# Altium footprint library Connectors.PcbLib: 268 footprints (part 20 of 21)
Each footprint in its own frame and in the unit in brackets; x right, y up, seen from the top. Pads: shape width x height; smd on the part's side, far side on the other; paste and mask are expansions set on the pad; w line width, h text height; cw(c..) or ccw(c..) is an arc to the next point about the centre after c.
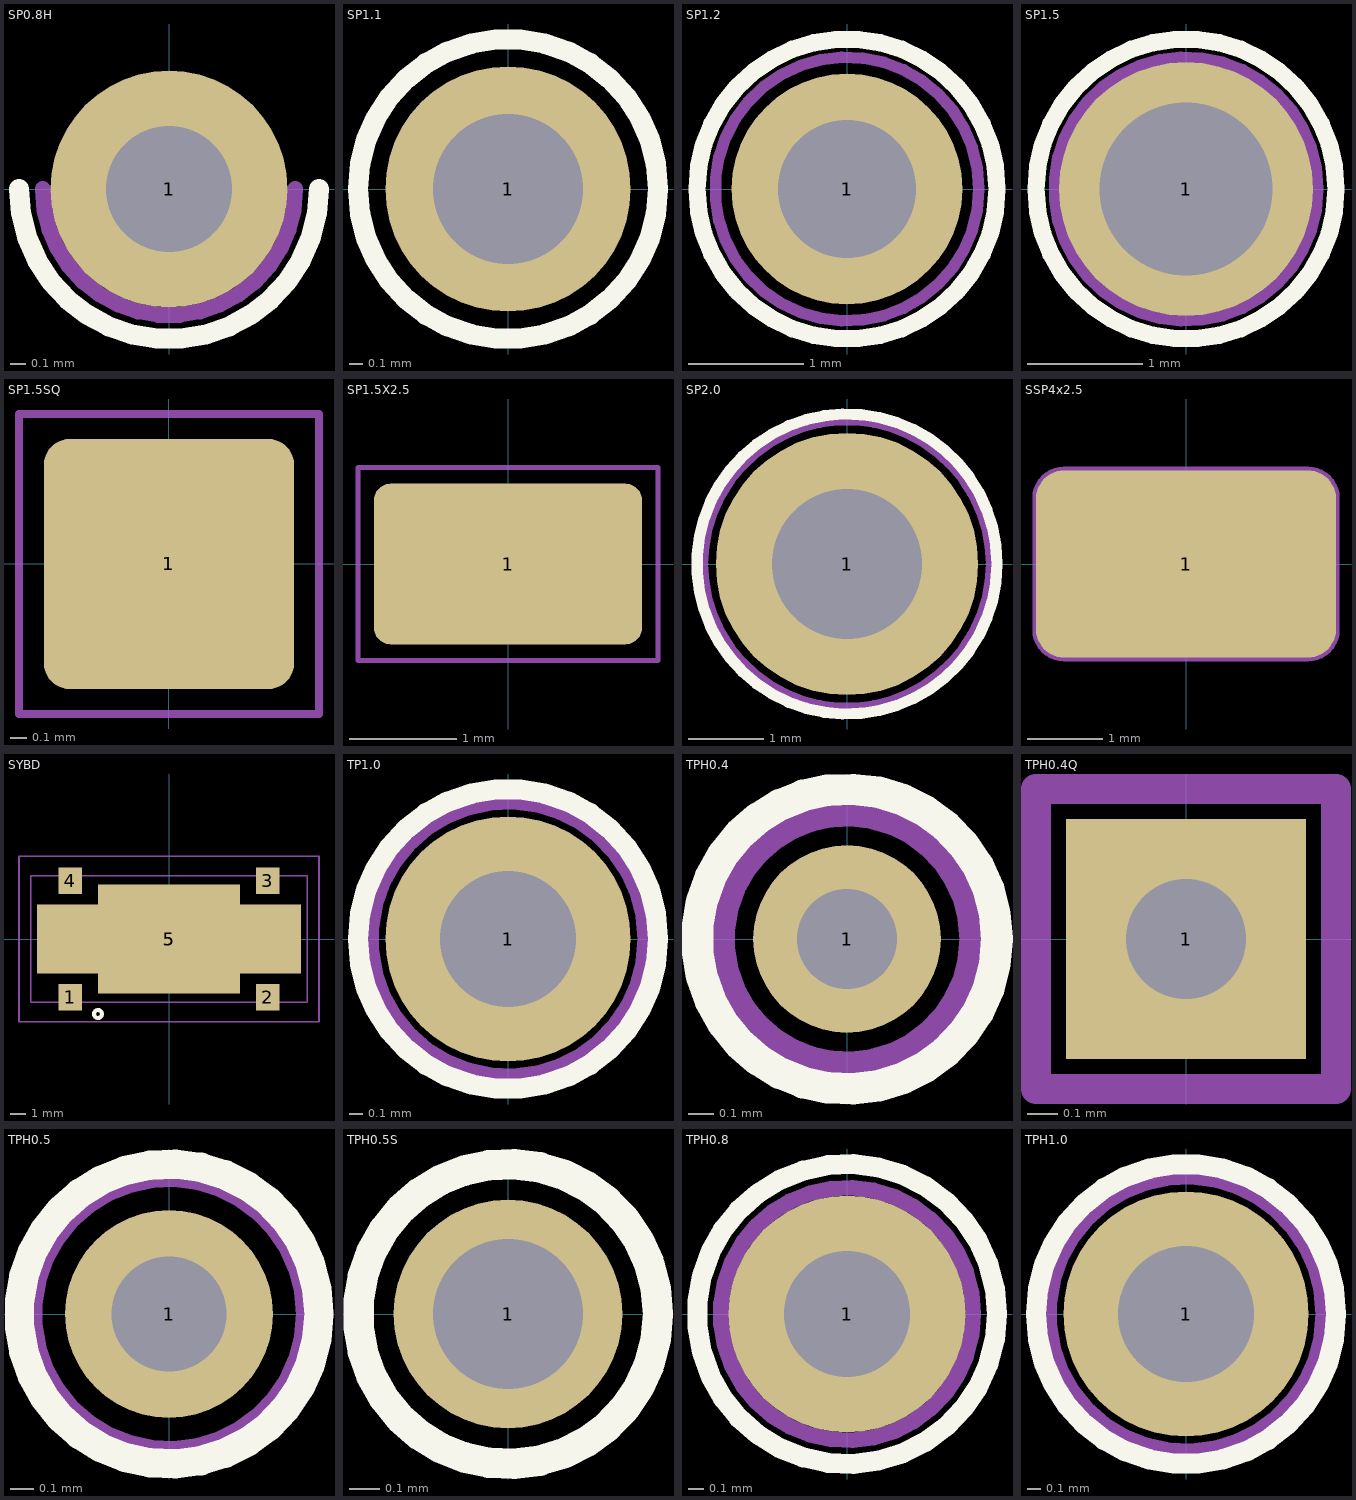
[diagram p19: the footprints below, top view; thin cyan lines are the x and y axes]

## SP0.8H [mm] "Solder pad 0.8mm half moon"
pads (1):
  round 1.5 hole 0.8: 1(0,0)
Top Overlay:
  lines w0.127: -0.95,0 ccw(c0,0) 0.95,0
Mechanical 13:
  lines w0.1: -0.8,0 ccw(c0,0) 0.8,0

## SP1.1 [mm] "Solder Pad 1.1mm"
pads (1):
  round 1.8 hole 1.1: 1(0,0)
Top Overlay:
  circle w0.15: c0,0 r1.1
Mechanical 13:
  circle w0.1: c0,0 r1.1

## SP1.2 [mm] "Solder Pad 1.2mm"
pads (1):
  round 2 hole 1.2: 1(0,0)
Top Overlay:
  circle w0.15: c0,0 r1.3
Mechanical 13:
  circle w0.1: c0,0 r1.143

## SP1.5 [mm] "Solder Pad 1.5mm"
pads (1):
  round 2.2 hole 1.5: 1(0,0)
Top Overlay:
  circle w0.15: c0,0 r1.3
Mechanical 13:
  circle w0.1: c0,0 r1.143

## SP1.5SQ [mm] "Solder Pad 1.5mm SMT"
pads (1):
  rrect20% 1.5x1.5 smd: 1(0,0)
Mechanical 13:
  lines w0.05: -0.9,-0.9 0.9,-0.9 0.9,0.9 -0.9,0.9 -0.9,-0.9

## SP1.5X2.5 [mm] "Solder Pad 1.5x2.5mm SMT"
pads (1):
  rrect20% 2.5x1.5 smd: 1(0,0)
Mechanical 13:
  lines w0.05: -1.4,-0.9 1.4,-0.9 1.4,0.9 -1.4,0.9 -1.4,-0.9

## SP2.0 [mm] "Solder Pin 2.0mm"
pads (1):
  round 3.5 hole 2: 1(0,0)
Top Overlay:
  circle w0.15: c0,0 r2
Mechanical 13:
  circle w0.1: c0,0 r1.9

## SSP4x2.5 [mm] "Solder pad 4x2.5mm SMD"
pads (1):
  rrect30% 4x2.5 smd: 1(0,0)
Mechanical 13:
  lines w0.1: -2,-0.875 ccw(c-1.625,-0.875) -1.625,-1.25 1.625,-1.25 ccw(c1.625,-0.875) 2,-0.875 2,0.875 ccw(c1.625,0.875) 1.625,1.25 -1.625,1.25 ccw(c-1.625,0.875) -2,0.875 -2,-0.875

## SYBD [mil] "High Power Bi-Directional Coupler"
height 129.92
pads (6):
  rect 60x67 smd: 1(-250,-147.5) 2(250,-147.5) 3(250,147.5) 4(-250,147.5)
  rect 670x175 smd: 5(0,0)
  rect 360x275 smd: 5(0,0)
Top Overlay:
  circle w10: c-180,-190 r10
Top Solder:
  rectangle: -340,-47.5 340,47.5
  region: -186,143 -186,88 186,88 186,143
  region: -186,-143 -186,-88 186,-88 186,-143
Mechanical 13:
  lines w4: -350,-160 -350,160 350,160 350,-160 -350,-160
Mechanical 15:
  lines w4: -380,-210 -380,210 380,210 380,-210 -380,-210
3D body: height 131, standoff 130, extent -170,-130 -130.16,-90.08
3D body: height 130, standoff 60, extent -200,-150 200,150
3D body: height 60, standoff 0, extent -350,-160 350,160

## TP1.0 [mm]
pads (1):
  round 1.8 hole 1: 1(0,0)
Top Overlay:
  circle w0.15: c0,0 r1.1
Mechanical 13:
  circle w0.1: c0,0 r1

## TPH0.4 [mm] "Test point TH 0.4mm"
pads (1):
  round 0.75 hole 0.4: 1(0,0)
Top Overlay:
  circle w0.127: c0,0 r0.6
Mechanical 13:
  circle w0.1: c0,0 r0.5

## TPH0.4Q [mm] "Test point TH 0.4mm + Square pad TB"
pads (1):
  rect 0.8x0.8 / inner round 0.8 / far side rect 0.8x0.8 hole 0.4: 1(0,0)
Mechanical 13:
  lines w0.1: -0.5,-0.5 -0.5,0.5 0.5,0.5 0.5,-0.5 -0.5,-0.5

## TPH0.5 [mm] "Test point TH 0.5mm"
pads (1):
  round 0.9 hole 0.5: 1(0,0)
Top Overlay:
  circle w0.127: c0,0 r0.65
Mechanical 13:
  circle w0.1: c0,0 r0.6

## TPH0.5S [mil] "Test point TH 0.5mm slim"
pads (1):
  round 30 hole 19.68: 1(0,0)
Top Overlay:
  circle w4: c0,0 r19.68
Mechanical 13:
  circle w3.94: c0,0 r11.81

## TPH0.8 [mm] "Test point TH 0.8mm"
pads (1):
  round 1.5 hole 0.8: 1(0,0)
Top Overlay:
  circle w0.127: c0,0 r0.95
Mechanical 13:
  circle w0.1: c0,0 r0.8

## TPH1.0 [mm]
pads (1):
  round 1.8 hole 1: 1(0,0)
Top Overlay:
  circle w0.15: c0,0 r1.1
Mechanical 13:
  circle w0.1: c0,0 r1